# Altium footprint library MyPcbLib.PcbLib: 222 footprints (part 6 of 14)
Each footprint in its own frame and in the unit in brackets; x right, y up, seen from the top. Pads: shape width x height; smd on the part's side, far side on the other; paste and mask are expansions set on the pad; w line width, h text height; cw(c..) or ccw(c..) is an arc to the next point about the centre after c.
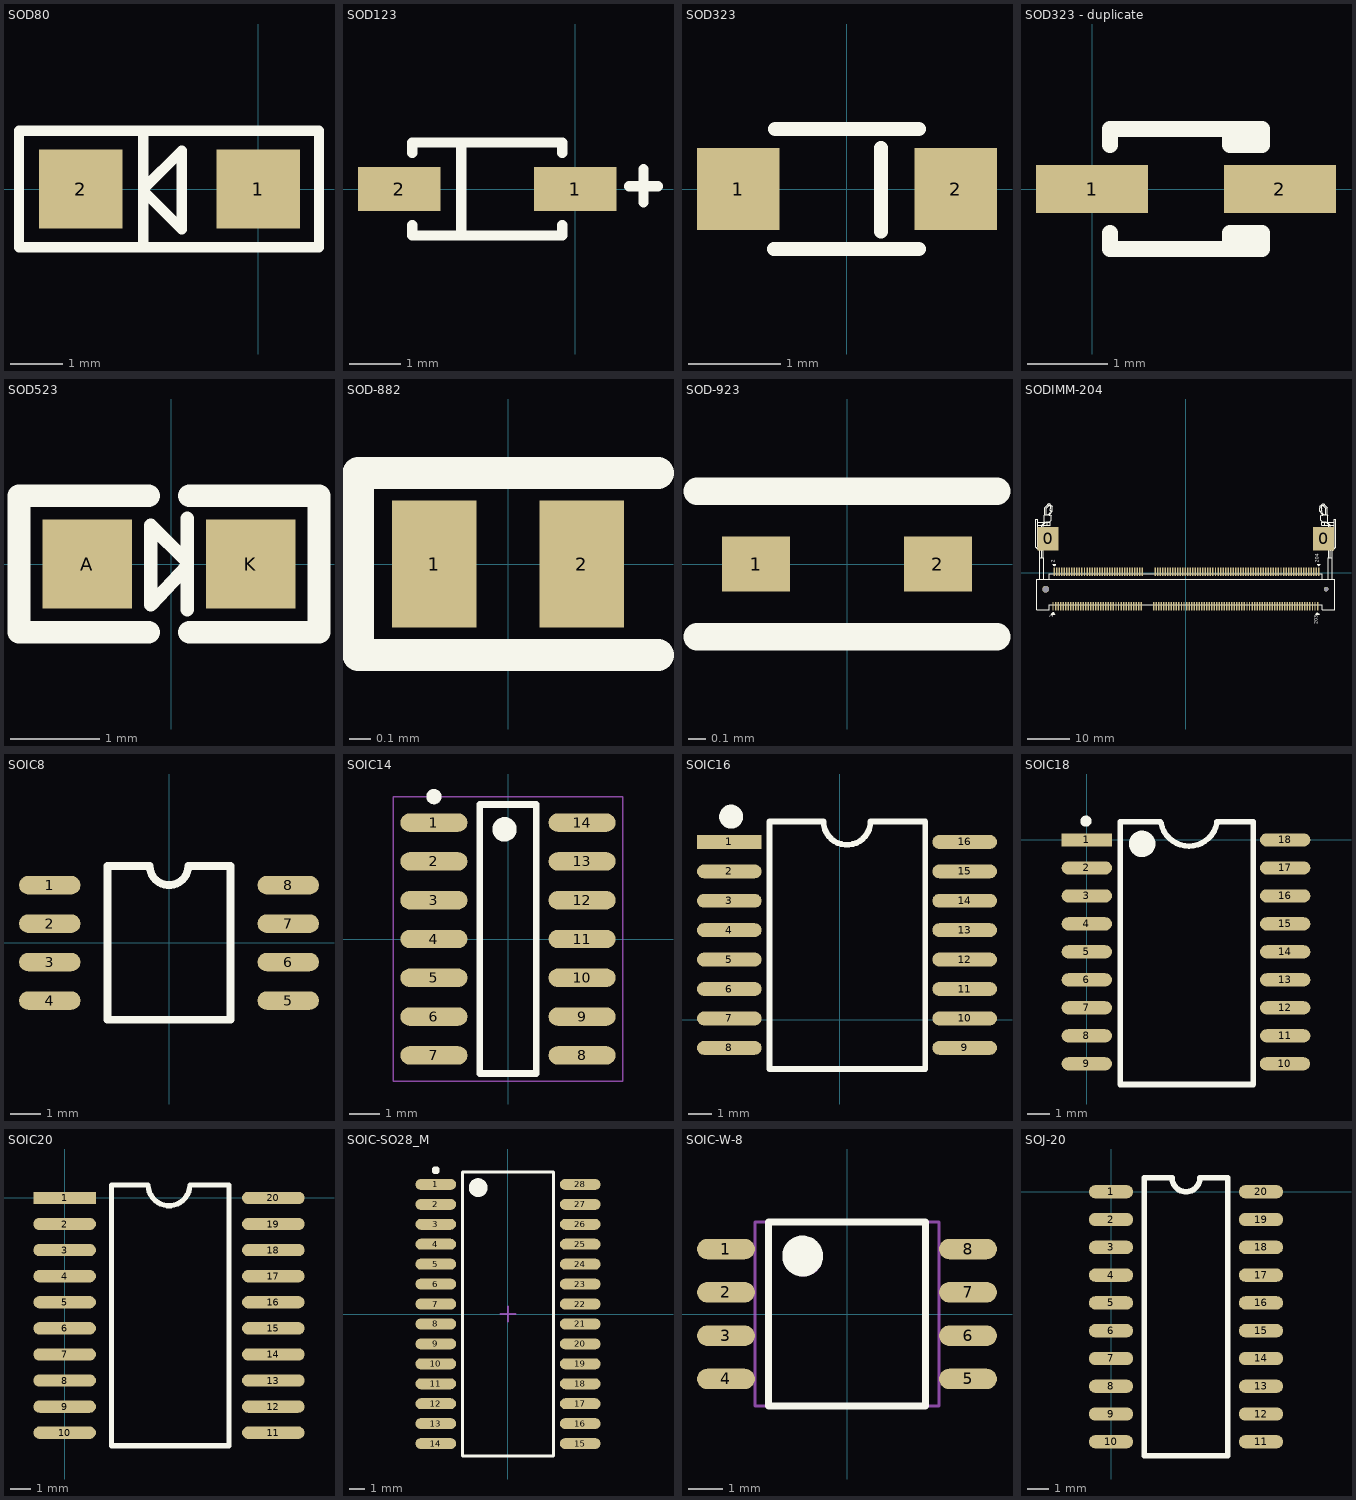
[diagram p5: the footprints below, top view; thin cyan lines are the x and y axes]

## SOD80 [mm] "LL34"
pads (2):
  rect 1.6x1.524 smd: 1(0,0) 2(-3.4,0)
Top Overlay:
  lines w0.2: -4.588,1.092 -4.588,-1.118 1.168,-1.118 1.168,1.067 ; -4.588,1.118 1.168,1.118 ; -2.2,-1.118 -2.2,1.118 ; -2.2,-0.035 -1.463,-0.772 -1.463,0.737 -2.2,0 -2.2,-0.035
3D body "SOD-80.STEP": height 1.5, standoff 0, extent -3.528,-0.75 -0.028,0.75

## SOD123 [mm] "1206"
pads (2):
  rect 1.6x0.85 smd: 1(0,0) 2(-3.4,0)
Top Overlay:
  lines w0.2: -3.15,-0.7 -3.15,-0.9 -0.25,-0.9 -0.25,-0.7 ; -3.15,0.7 -3.15,0.9 -0.25,0.9 -0.25,0.7 ; -2.2,-0.9 -2.2,0.9 ; 1.043,0.051 1.602,0.051 ; 1.323,-0.254 1.323,0.381
3D body "User Library-SOD-123_DiodesInc.STEP": height 1.42, standoff -0.03, extent -3.596,-0.853 0.254,0.847

## SOD323 [mil] "SODFL, 2-Leads, Body 1.30x2.60mm, IPC Medium Density"
height 39.37
pads (2):
  rect 35x35 smd: 1(-46.26,0) 2(46.26,0)
Top Overlay:
  lines w6: -31,-25.5 30.5,-25.5 ; -30.5,25.5 30.5,25.5 ; 14.44,-18 14.44,17.5
3D body "SOD323.step": height 39.37, standoff 0, extent -51.18,-27.56 51.18,27.56

## SOD323 - duplicate [mm] "0805"
pads (2):
  rect 1.4x0.6 smd: 1(0,0) 2(2.35,0)
Top Overlay:
  lines w0.2: 0.225,-0.55 0.225,-0.75 2.125,-0.75 2.125,-0.55 1.725,-0.55 1.725,-0.75 ; 0.225,0.55 0.225,0.75 2.125,0.75 2.125,0.55 1.725,0.55 1.725,0.75
3D body "SOD-323.STEP": height 1, standoff 0, extent -0.169,-0.667 2.431,0.633

## SOD523 [mm] "0603"
pads (2):
  rect 1x1 smd: A(-0.94,0) K(0.889,0)
Top Overlay:
  lines w0.152: 0.178,-0.508 0.178,0.508 ; 0.178,-0.025 -0.229,-0.457 -0.229,0.432 0.178,0.025
  lines w0.254: -0.254,-0.762 -1.702,-0.762 -1.702,0.762 -0.254,0.762 ; 0.203,-0.762 1.651,-0.762 1.651,0.762 0.203,0.762
3D body "SOD-523.STEP": height 0.65, standoff 0, extent -0.813,-0.381 0.787,0.419

## SOD-882 [mm]
height 0.5
pads (2):
  rect 0.4x0.6 smd: 1(-0.35,0) 2(0.35,0)
Top Overlay:
  lines w0.152: 0.711,-0.432 -0.711,-0.432 -0.711,0.432 0.711,0.432
3D body "SOD-882.STEP": height 0.5, standoff 0, extent -0.52,-0.32 0.52,0.32

## SOD-923 [mil]
pads (2):
  rect 15x12 smd: 1(-20,0) 2(20,0)
Top Overlay:
  lines w6: -33,-16 33,-16 ; -33,16 33,16
3D body "SOD-923.STEP": height 15.75, standoff 0, extent -20.87,-12.7 20.47,12.8

## SODIMM-204 [mm]
pads (208):
  round 1.6 hole 1.6 unplated: 0(-33.4,-3.95)
  rect 5x5.5 smd: 0(-32.8,8.05) 0(32.8,8.05)
  round 1.1 hole 1.1 unplated: 0(33.4,-3.95)
  rect 0.35x2 smd: 1(-31.65,-8.05) 2(-31.35,0.15) 3(-31.05,-8.05) 4(-30.75,0.15) 5(-30.45,-8.05) 6(-30.15,0.15) 7(-29.85,-8.05) 8(-29.55,0.15) 9(-29.25,-8.05) 10(-28.95,0.15) 11(-28.65,-8.05) 12(-28.35,0.15) 13(-28.05,-8.05) 14(-27.75,0.15) 15(-27.45,-8.05) 16(-27.15,0.15) 17(-26.85,-8.05) 18(-26.55,0.15) 19(-26.25,-8.05) 20(-25.95,0.15) 21(-25.65,-8.05) 22(-25.35,0.15) 23(-25.05,-8.05) 24(-24.75,0.15) 25(-24.45,-8.05) 26(-24.15,0.15) 27(-23.85,-8.05) 28(-23.55,0.15) 29(-23.25,-8.05) 30(-22.95,0.15) 31(-22.65,-8.05) 32(-22.35,0.15) 33(-22.05,-8.05) 34(-21.75,0.15) 35(-21.45,-8.05) 36(-21.15,0.15) 37(-20.85,-8.05) 38(-20.55,0.15) 39(-20.25,-8.05) 40(-19.95,0.15) 41(-19.65,-8.05) 42(-19.35,0.15) 43(-19.05,-8.05) 44(-18.75,0.15) 45(-18.45,-8.05) 46(-18.15,0.15) 47(-17.85,-8.05) 48(-17.55,0.15) 49(-17.25,-8.05) 50(-16.95,0.15) 51(-16.65,-8.05) 52(-16.35,0.15) 53(-16.05,-8.05) 54(-15.75,0.15) 55(-15.45,-8.05) 56(-15.15,0.15) 57(-14.85,-8.05) 58(-14.55,0.15) 59(-14.25,-8.05) 60(-13.95,0.15) 61(-13.65,-8.05) 62(-13.35,0.15) 63(-13.05,-8.05) 64(-12.75,0.15) 65(-12.45,-8.05) 66(-12.15,0.15) 67(-11.85,-8.05) 68(-11.55,0.15) 69(-11.25,-8.05) 70(-10.95,0.15) 71(-10.65,-8.05) 72(-10.35,0.15) 73(-7.65,-8.05) 74(-7.35,0.15) 75(-7.05,-8.05) 76(-6.75,0.15) 77(-6.45,-8.05) 78(-6.15,0.15) 79(-5.85,-8.05) 80(-5.55,0.15) 81(-5.25,-8.05) 82(-4.95,0.15) 83(-4.65,-8.05) 84(-4.35,0.15) 85(-4.05,-8.05) 86(-3.75,0.15) 87(-3.45,-8.05) 88(-3.15,0.15) 89(-2.85,-8.05) 90(-2.55,0.15) 91(-2.25,-8.05) 92(-1.95,0.15) 93(-1.65,-8.05) 94(-1.35,0.15) 95(-1.05,-8.05) 96(-0.75,0.15) 97(-0.45,-8.05) 98(-0.15,0.15) 99(0.15,-8.05) 100(0.45,0.15) 101(0.75,-8.05) 102(1.05,0.15) 103(1.35,-8.05) 104(1.65,0.15) 105(1.95,-8.05) 106(2.25,0.15) 107(2.55,-8.05) 108(2.85,0.15) 109(3.15,-8.05) 110(3.45,0.15) 111(3.75,-8.05) 112(4.05,0.15) 113(4.35,-8.05) 114(4.65,0.15) 115(4.95,-8.05) 116(5.25,0.15) 117(5.55,-8.05) 118(5.85,0.15) 119(6.15,-8.05) 120(6.45,0.15) 121(6.75,-8.05) 122(7.05,0.15) 123(7.35,-8.05) 124(7.65,0.15) 125(7.95,-8.05) 126(8.25,0.15) 127(8.55,-8.05) 128(8.85,0.15) 129(9.15,-8.05) 130(9.45,0.15) 131(9.75,-8.05) 132(10.05,0.15) 133(10.35,-8.05) 134(10.65,0.15) 135(10.95,-8.05) 136(11.25,0.15) 137(11.55,-8.05) 138(11.85,0.15) 139(12.15,-8.05) 140(12.45,0.15) 141(12.75,-8.05) 142(13.05,0.15) 143(13.35,-8.05) 144(13.65,0.15) 145(13.95,-8.05) 146(14.25,0.15) 147(14.55,-8.05) 148(14.85,0.15) 149(15.15,-8.05) 150(15.45,0.15) 151(15.75,-8.05) 152(16.05,0.15) 153(16.35,-8.05) 154(16.65,0.15) 155(16.95,-8.05) 156(17.25,0.15) 157(17.55,-8.05) 158(17.85,0.15) 159(18.15,-8.05) 160(18.45,0.15) 161(18.75,-8.05) 162(19.05,0.15) 163(19.35,-8.05) 164(19.65,0.15) 165(19.95,-8.05) 166(20.25,0.15) 167(20.55,-8.05) 168(20.85,0.15) 169(21.15,-8.05) 170(21.45,0.15) 171(21.75,-8.05) 172(22.05,0.15) 173(22.35,-8.05) 174(22.65,0.15) 175(22.95,-8.05) 176(23.25,0.15) 177(23.55,-8.05) 178(23.85,0.15) 179(24.15,-8.05) 180(24.45,0.15) 181(24.75,-8.05) 182(25.05,0.15) 183(25.35,-8.05) 184(25.65,0.15) 185(25.95,-8.05) 186(26.25,0.15) 187(26.55,-8.05) 188(26.85,0.15) 189(27.15,-8.05) 190(27.45,0.15) 191(27.75,-8.05) 192(28.05,0.15) 193(28.35,-8.05) 194(28.65,0.15) 195(28.95,-8.05) 196(29.25,0.15) 197(29.55,-8.05) 198(29.85,0.15) 199(30.15,-8.05) 200(30.45,0.15) 201(30.75,-8.05) 202(31.05,0.15) 203(31.35,-8.05) 204(31.65,0.15)
Top Overlay:
  drawing of 191 lines, arcs and shapes, not listed
  text "204" at 32.014,2.311 h1.52
  text "203" at 31.76,-12.256 h1.52
  text "2" at -30.937,2.387 h1.52
  text "1" at -31.179,-10.82 h1.52
3D body "DDR3 SODIMM-204Pin.STEP": height 5.65, standoff -0.5, extent -35.802,-8.967 35.799,17.573

## SOIC8 [mil]
pads (8):
  oval 80x24 smd: 1(-155,75) 2(-155,25) 3(-155,-25) 4(-155,-75) 5(155,-75) 6(155,-25) 7(155,25) 8(155,75)
Top Overlay:
  lines w10: -80,-100 -80,100 -25,100 ccw(c0,100) 25,100 80,100 80,-100 -80,-100
3D body "SOIC8.STEP": height 90.55, standoff -0.78, extent -167.2,-105.9 163.21,105.91

## SOIC14 [mm]
height 1.75
pads (14):
  oval 2.2x0.6 smd: 1(-2.425,3.81) 2(-2.425,2.54) 3(-2.425,1.27) 4(-2.425,0) 5(-2.425,-1.27) 6(-2.425,-2.54) 7(-2.425,-3.81) 8(2.425,-3.81) 9(2.425,-2.54) 10(2.425,-1.27) 11(2.425,0) 12(2.425,1.27) 13(2.425,2.54) 14(2.425,3.81)
Top Overlay:
  circle w0.4: c-0.115,3.59 r0.2
  circle w0.25: c-2.425,4.66 r0.125
  lines w0.22: -0.925,-4.4 0.925,-4.4 0.925,4.4 -0.925,4.4 -0.925,-4.4
Mechanical 15:
  lines w0.05: -3.75,-4.65 3.75,-4.65 3.75,4.65 -3.75,4.65 -3.75,-4.65
3D body "SOIC14.STEP": height 1.75, standoff 0, extent -2.896,-4.237 2.904,4.293

## SOIC16 [mil]
pads (16):
  rect 110x23.62 smd: 1(-188,302)
  oval 110x23.62 smd: 2(-188,252) 3(-188,202) 4(-188,152) 5(-188,102) 6(-188,52) 7(-188,2) 8(-188,-48) 9(212,-48) 10(212,2) 11(212,52) 12(212,102) 13(212,152) 14(212,202) 15(212,252) 16(212,302)
Top Overlay:
  lines w10: -120,335 -120,-84 145,-84 145,335 ; -120,337 -28,337 ccw(c12,337) 52,337 145,337
  lines w20: -195.28,345.79 ccw(c-185,345) -194.93,347.77
3D body "User Library-SOIC16_Wide_JEDEC_MS-013AA.step": height 108.23, standoff 3.9, extent -194.25,-79.69 224.25,333.69

## SOIC18 [mm]
height 2.36
pads (18):
  rect 2.286x0.6 smd: 1(0,0)
  oval 2.286x0.6 smd: 2(0,-1.27) 3(0,-2.54) 4(0,-3.81) 5(0,-5.08) 6(0,-6.35) 7(0,-7.62) 8(0,-8.89) 9(0,-10.16) 10(8.989,-10.16) 11(8.999,-8.89) 12(8.999,-7.62) 13(8.999,-6.35) 14(8.999,-5.08) 15(8.999,-3.81) 16(8.999,-2.54) 17(8.999,-1.27) 18(8.999,0)
Top Overlay:
  circle w0.25: c-0.041,0.85 r0.125
  circle w0.6: c2.509,-0.18 r0.3
  lines w0.254: 3.34,0.82 1.509,0.82 1.509,-11.1 7.559,-11.1 7.559,0.82 5.906,0.82 ; 3.364,0.764 ccw(c4.635,1.014) 5.906,0.762
3D body "PIC16F819-I-SOIC18 (1).step": height 2.31, standoff -0.2, extent -0.686,-10.845 9.654,0.685

## SOIC20 [mm]
pads (20):
  rect 3.048x0.6 smd: 1(0,0)
  oval 3.048x0.6 smd: 2(0,-1.27) 3(0,-2.54) 4(0,-3.81) 5(0,-5.08) 6(0,-6.35) 7(0,-7.62) 8(0,-8.89) 9(0,-10.16) 10(0,-11.43) 11(10.16,-11.43) 12(10.16,-10.16) 13(10.16,-8.89) 14(10.16,-7.62) 15(10.16,-6.35) 16(10.16,-5.08) 17(10.16,-3.81) 18(10.16,-2.54) 19(10.16,-1.27) 20(10.16,0)
Top Overlay:
  lines w0.254: 2.286,-12.065 8.001,-12.065 8.001,0.635 6.096,0.635 cw(c5.08,0.635) 4.064,0.635 2.286,0.635 2.286,-12.065
3D body "User Library-SOIC20-300.STEP": height 2.65, standoff 0, extent -0.045,-12.09 10.255,0.71

## SOIC-SO28_M [mm] "SOIC, 28-Leads, Body 17.9x7.5mm, Pitch 1.27mm, IPC Low Density"
height 2.65
pads (28):
  oval 2.6x0.7 smd: 1(-4.6,8.255) 2(-4.6,6.985) 3(-4.6,5.715) 4(-4.6,4.445) 5(-4.6,3.175) 6(-4.6,1.905) 7(-4.6,0.635) 8(-4.6,-0.635) 9(-4.6,-1.905) 10(-4.6,-3.175) 11(-4.6,-4.445) 12(-4.6,-5.715) 13(-4.6,-6.985) 14(-4.6,-8.255) 15(4.6,-8.255) 16(4.6,-6.985) 17(4.6,-5.715) 18(4.6,-4.445) 19(4.6,-3.175) 20(4.6,-1.905) 21(4.6,-0.635) 22(4.6,0.635) 23(4.6,1.905) 24(4.6,3.175) 25(4.6,4.445) 26(4.6,5.715) 27(4.6,6.985) 28(4.6,8.255)
Top Overlay:
  circle w0.25: c-4.6,9.155 r0.125
  circle w0.6: c-1.9,8.05 r0.3
  lines w0.2: -2.9,-9.05 -2.9,9.05 2.9,9.05 2.9,-9.05 -2.9,-9.05
Mechanical 15:
  lines w0.1: -0.5,0 0.5,0 ; 0,-0.5 0,0.5
3D body "User Library-80072036 SO28.STEP": height 2.63, standoff -0.01, extent -5.36,-9.012 5.31,9.068

## SOIC-W-8 [mm]
pads (8):
  oval 1.7x0.6 smd: 1(-3.55,1.905) 2(-3.55,0.635) 3(-3.55,-0.635) 4(-3.55,-1.905) 5(3.55,-1.905) 6(3.55,-0.635) 7(3.55,0.635) 8(3.55,1.905)
Top Overlay:
  circle w0.6: c-1.3,1.7 r0.3
  lines w0.2: -2.3,-2.7 -2.3,2.7 2.3,2.7 2.3,-2.7 -2.3,-2.7
Mechanical 13:
  circle w0.1: c-1.27,1.651 r0.5
  lines w0.1: -2.7,-2.7 -2.7,2.7 2.7,2.7 2.7,-2.7 -2.7,-2.7
3D body "SOIC-W-8.step": height 2.16, standoff 0, extent -3.95,-2.7 3.95,2.7

## SOJ-20 [mil]
pads (20):
  oval 80x24 smd: 1(0,0) 2(0,-50) 3(0,-100) 4(0,-150) 5(0,-200) 6(0,-250) 7(0,-300) 8(0,-350) 9(0,-400) 10(0,-450) 11(270,-450) 12(270,-400) 13(270,-350) 14(270,-300) 15(270,-250) 16(270,-200) 17(270,-150) 18(270,-100) 19(270,-50) 20(270,0)
Top Overlay:
  lines w10: 60,-475 60,25 110,25 ccw(c135,25) 160,25 210,25 210,-475 60,-475
3D body "Soj20.STEP": height 78.74, standoff 0, extent -6.64,-468.36 275.4,23.77